# Altium footprint library UAARG Autopilot.PcbLib: 95 footprints (part 3 of 6)
Each footprint in its own frame and in the unit in brackets; x right, y up, seen from the top. Pads: shape width x height; smd on the part's side, far side on the other; paste and mask are expansions set on the pad; w line width, h text height; cw(c..) or ccw(c..) is an arc to the next point about the centre after c.
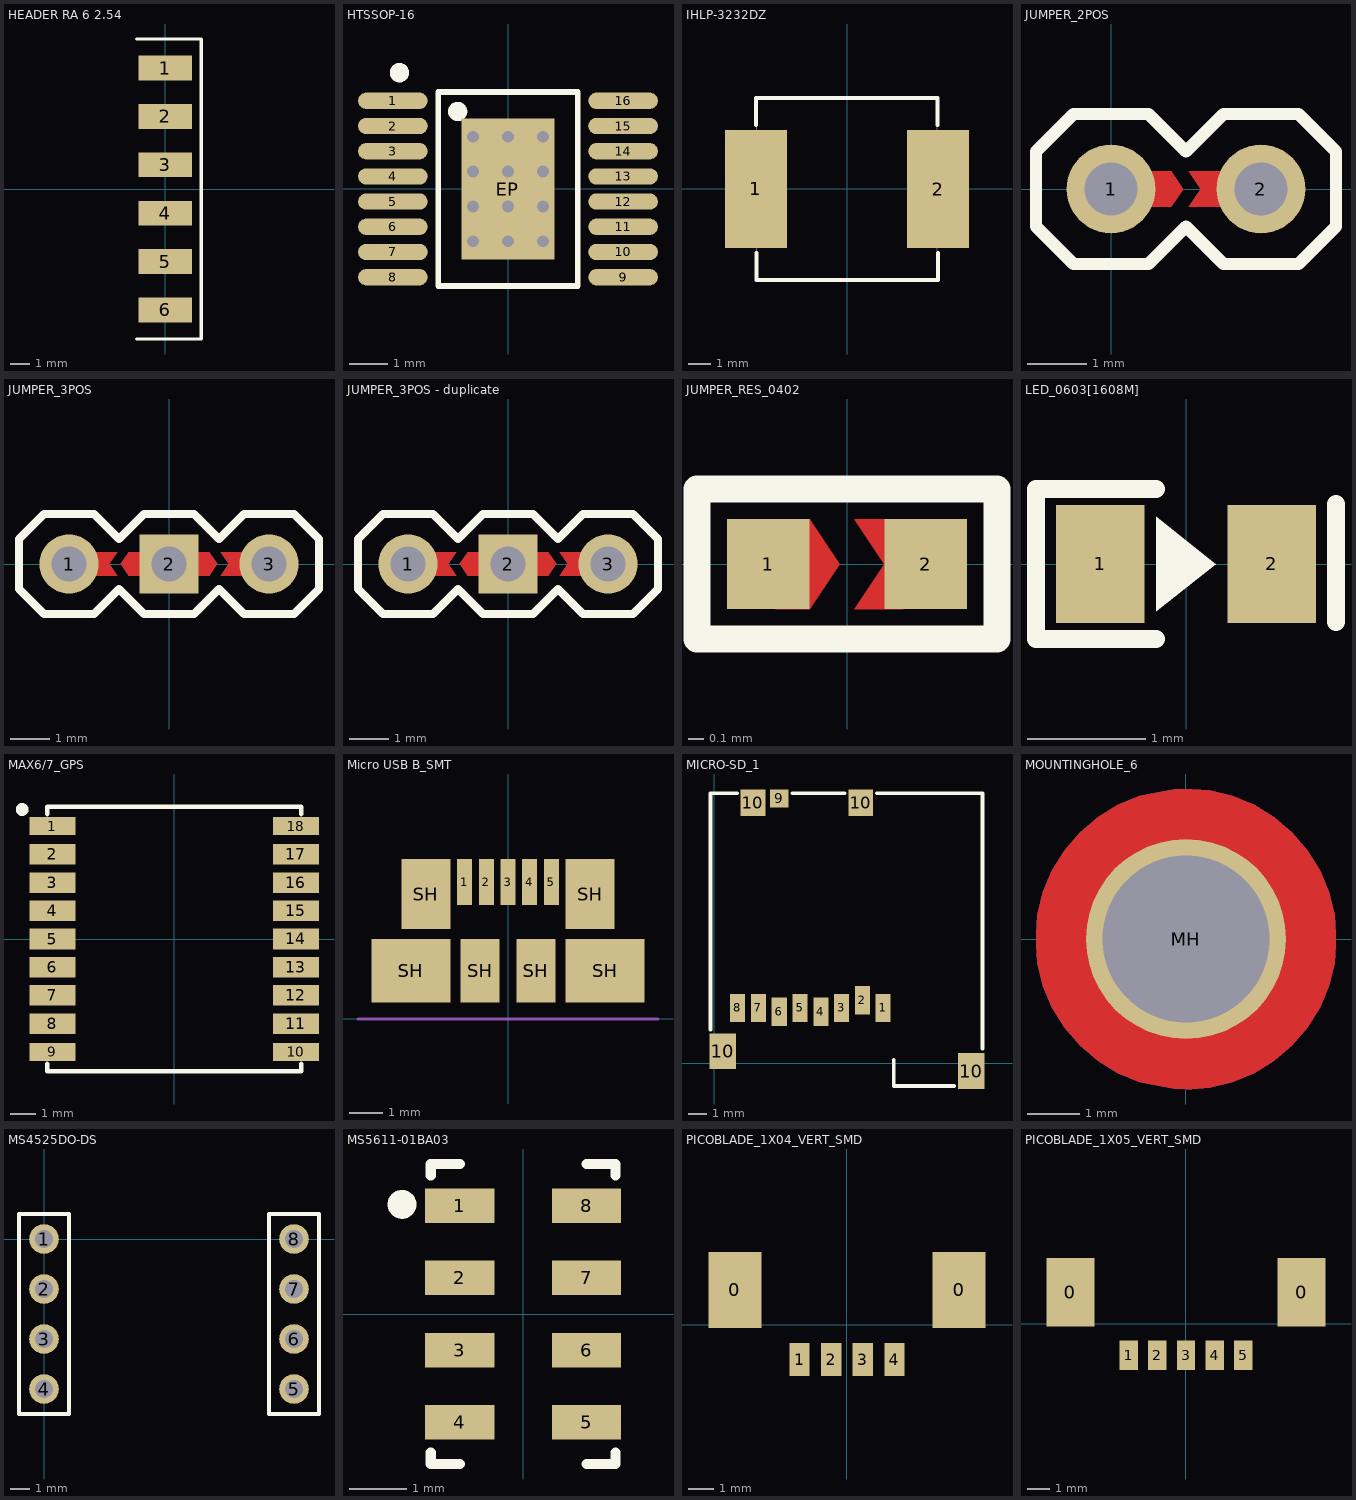
[diagram p2: the footprints below, top view; thin cyan lines are the x and y axes]

## HEADER RA 6 2.54 [mm] "CONN 3M male pin header 6 SMD 961106-5500"
height 2.5
pads (6):
  rect 2.8x1.3 smd: 1(0,6.35) 2(0,3.81) 3(0,1.27) 4(0,-1.27) 5(0,-3.81) 6(0,-6.35)
Top Overlay:
  lines w0.178: -1.5,-7.874 1.905,-7.874 1.905,7.874 -1.5,7.874
3D body: height 2.5, standoff 0, extent -10.818,-7.54 0.682,7.7

## HTSSOP-16 [mm] "Thin-Shrink Small Outline Package (TSSOP), 16-Leads, Body 4.4x5.0mm, Pitch 0.65mm, IPC Medium Density with exposed pad"
height 1.2
pads (17):
  oval 1.8x0.42 smd: 1(-2.97,2.275) 2(-2.97,1.625) 3(-2.97,0.975) 4(-2.97,0.325) 5(-2.97,-0.325) 6(-2.97,-0.975) 7(-2.97,-1.625) 8(-2.97,-2.275) 9(2.97,-2.275) 10(2.97,-1.625) 11(2.97,-0.975) 12(2.97,-0.325) 13(2.97,0.325) 14(2.97,0.975) 15(2.97,1.625) 16(2.97,2.275)
  rect 2.41x3.65 smd: EP(0,0)
via 0,-1.35 diameter 0.61 hole 0.305
via -0.9,-1.35 diameter 0.61 hole 0.305
via 0.9,-1.35 diameter 0.61 hole 0.305
via 0,-0.45 diameter 0.61 hole 0.305
via -0.9,-0.45 diameter 0.61 hole 0.305
via 0.9,-0.45 diameter 0.61 hole 0.305
via -0.9,1.35 diameter 0.61 hole 0.305
via 0.9,1.35 diameter 0.61 hole 0.305
via 0,1.35 diameter 0.61 hole 0.305
via 0.9,0.45 diameter 0.61 hole 0.305
via -0.9,0.45 diameter 0.61 hole 0.305
via 0,0.45 diameter 0.61 hole 0.305
Top Overlay:
  circle w0.25: c-1.3,2 r0.125
  circle w0.25: c-2.8,3 r0.125
  lines w0.152: -1.8,-2.5 -1.8,2.5 1.8,2.5 1.8,-2.5 -1.8,-2.5
3D body: height 1, standoff 0, extent -3.2,-2.5 3.2,2.5

## IHLP-3232DZ [mil] "SMT Inductor IHLP-3232DZ 322x322x158mil"
height 158
pads (2):
  rect 110x210 smd: 1(-162.4,0) 2(162.4,-0.01)
Top Overlay:
  lines w7: -162.4,114.17 -162.4,162.4 161.42,162.4 161.42,114.17 ; -161.42,-114.18 -161.42,-162.41 162.4,-162.41 162.4,-114.18
Mechanical 1:
  lines w1: -170,-100 -116,-100 -116,100 -170,100 -170,-100 ; -161,-161 161,-161 161,161 -161,161 -161,-161 ; 116,-100 170,-100 170,100 116,100 116,-100
3D body: height 158, standoff 5, extent -161,-161 161,161
3D body: height 120, standoff 0, extent 116,-100 170,100
3D body: height 120, standoff 0, extent -170,-100 -116,100

## JUMPER_2POS [mm] "Multi Jumper 2 positions"
pads (2):
  round 1.5 hole 0.9: 1(0,0) 2(2.54,0)
Top Layer:
  region: 0.675,0.3 1.02,0.3 1.22,0 1.02,-0.3 0.675,-0.3
  region: 1.32,0.3 1.52,0 1.32,-0.3 2,-0.3 2,0.3
Bottom Layer:
  region: 0.675,-0.3 1.02,-0.3 1.22,0 1.02,0.3 0.675,0.3
  region: 1.32,-0.3 1.52,0 1.32,0.3 2,0.3 2,-0.3
Top Overlay:
  lines w0.203: -1.27,-0.635 -0.635,-1.27 0.635,-1.27 1.27,-0.635 1.905,-1.27 3.175,-1.27 3.81,-0.635 3.81,0.635 3.175,1.27 1.905,1.27 1.27,0.635 0.635,1.27 -0.635,1.27 -1.27,0.635 -1.27,-0.635
Top Solder:
  rectangle: 0.525,-0.4 2,0.4
Bottom Solder:
  rectangle: 0.525,-0.4 2,0.4
Multi-Layer:
  rectangle: 0,-0.75 0.75,0.75
  region: 2.54,0.75 1.79,0.75 1.79,-0.75 2.54,-0.75
3D body: height 8.6, standoff -3, extent -1.17,-1.246 3.91,1.253

## JUMPER_3POS [mm] "Multi Jumper 3 positions"
pads (3):
  round 1.5 hole 0.9: 1(-2.54,0) 3(2.54,0)
  rect 1.5x1.5 hole 0.9: 2(0,0)
Top Layer:
  region: 1.32,0.3 1.52,0 1.32,-0.3 2,-0.3 2,0.3
  region: 0.675,0.3 1.02,0.3 1.22,0 1.02,-0.3 0.675,-0.3
  region: -0.675,-0.3 -1.02,-0.3 -1.22,0 -1.02,0.3 -0.675,0.3
  region: -1.32,-0.3 -1.52,0 -1.32,0.3 -2,0.3 -2,-0.3
Bottom Layer:
  region: 1.32,-0.3 1.52,0 1.32,0.3 2,0.3 2,-0.3
  region: 0.675,-0.3 1.02,-0.3 1.22,0 1.02,0.3 0.675,0.3
  region: -0.675,0.3 -1.02,0.3 -1.22,0 -1.02,-0.3 -0.675,-0.3
  region: -1.32,0.3 -1.52,0 -1.32,-0.3 -2,-0.3 -2,0.3
Top Overlay:
  lines w0.203: -3.81,-0.635 -3.175,-1.27 -1.905,-1.27 -1.27,-0.635 -0.635,-1.27 0.635,-1.27 1.27,-0.635 1.905,-1.27 3.175,-1.27 3.81,-0.635 3.81,0.635 3.175,1.27 1.905,1.27 1.27,0.635 0.635,1.27 -0.635,1.27 -1.27,0.635 -1.905,1.27 -3.175,1.27 -3.81,0.635 -3.81,-0.635
Top Solder:
  rectangle: 0.525,-0.4 2,0.4
  region: -0.525,0.4 -2,0.4 -2,-0.4 -0.525,-0.4
Bottom Solder:
  rectangle: 0.525,-0.4 2,0.4
  region: -0.525,0.4 -2,0.4 -2,-0.4 -0.525,-0.4
Multi-Layer:
  region: 2.54,0.75 1.79,0.75 1.79,-0.75 2.54,-0.75
  rectangle: -2.54,-0.75 -1.79,0.75
3D body: height 8.6, standoff -3, extent -3.71,-1.246 3.91,1.253

## JUMPER_3POS - duplicate [mm] "Multi Jumper 3 positions"
pads (3):
  round 1.5 hole 0.9: 1(-2.54,0) 3(2.54,0)
  rect 1.5x1.5 hole 0.9: 2(0,0)
Top Layer:
  region: 1.32,0.3 1.52,0 1.32,-0.3 2,-0.3 2,0.3
  region: 0.675,0.3 1.02,0.3 1.22,0 1.02,-0.3 0.675,-0.3
  region: -0.675,-0.3 -1.02,-0.3 -1.22,0 -1.02,0.3 -0.675,0.3
  region: -1.32,-0.3 -1.52,0 -1.32,0.3 -2,0.3 -2,-0.3
Bottom Layer:
  region: 1.32,-0.3 1.52,0 1.32,0.3 2,0.3 2,-0.3
  region: 0.675,-0.3 1.02,-0.3 1.22,0 1.02,0.3 0.675,0.3
  region: -0.675,0.3 -1.02,0.3 -1.22,0 -1.02,-0.3 -0.675,-0.3
  region: -1.32,0.3 -1.52,0 -1.32,-0.3 -2,-0.3 -2,0.3
Top Overlay:
  lines w0.203: -3.81,-0.635 -3.175,-1.27 -1.905,-1.27 -1.27,-0.635 -0.635,-1.27 0.635,-1.27 1.27,-0.635 1.905,-1.27 3.175,-1.27 3.81,-0.635 3.81,0.635 3.175,1.27 1.905,1.27 1.27,0.635 0.635,1.27 -0.635,1.27 -1.27,0.635 -1.905,1.27 -3.175,1.27 -3.81,0.635 -3.81,-0.635
Top Solder:
  rectangle: 0.525,-0.4 2,0.4
  region: -0.525,0.4 -2,0.4 -2,-0.4 -0.525,-0.4
Bottom Solder:
  rectangle: 0.525,-0.4 2,0.4
  region: -0.525,0.4 -2,0.4 -2,-0.4 -0.525,-0.4
Multi-Layer:
  region: 2.54,0.75 1.79,0.75 1.79,-0.75 2.54,-0.75
  rectangle: -2.54,-0.75 -1.79,0.75
3D body: height 8.6, standoff -3, extent -3.71,-1.246 3.91,1.253

## JUMPER_RES_0402 [mm] "Chip SMD Resistor Body 1.0x0.5mm, IPC Low Density with footprint for solder jumper"
height 0.4
pads (2):
  rect 0.55x0.6 smd: 1(-0.525,0) 2(0.525,0)
Top Layer:
  region: 0.05,0.3 0.25,0 0.05,-0.3 0.375,-0.3 0.375,0.3
  region: -0.475,0.3 -0.25,0.3 -0.05,0 -0.25,-0.3 -0.475,-0.3
Top Overlay:
  lines w0.178: -1,-0.5 1,-0.5 1,0.5 -1,0.5 -1,-0.5
Top Solder:
  rectangle: -0.15,-0.4 0.15,0.4
3D body: height 0.34, standoff -0.01, extent -0.5,-0.25 0.5,0.25

## LED_0603[1608M] [mm] "Chip SMD LED Body 1.6x0.8mm, IPC Low Density"
height 0.25
pads (2):
  rect 0.75x1 smd: 1(-0.725,0) 2(0.725,0)
Top Overlay:
  region: 0.25,0 -0.25,-0.4 -0.25,0.4
  lines w0.152: -0.254,-0.635 -1.27,-0.635 -1.27,0.635 -0.254,0.635 ; 1.27,-0.492 1.27,0.508
3D body: height 0.25, standoff 0, extent -0.8,-0.4 0.8,0.4

## MAX6/7_GPS [mm] "u-blox MAX6/7 GNSS module"
height 2.5
pads (18):
  rect 1.8x0.7 smd mask+0.03: 1(-4.75,4.4) 9(-4.75,-4.4) 10(4.75,-4.4) 18(4.75,4.4)
  rect 1.8x0.8 smd mask+0.03: 2(-4.75,3.3) 3(-4.75,2.2) 4(-4.75,1.1) 5(-4.75,0) 6(-4.75,-1.1) 7(-4.75,-2.2) 8(-4.75,-3.3) 11(4.75,-3.3) 12(4.75,-2.2) 13(4.75,-1.1) 14(4.75,0) 15(4.75,1.1) 16(4.75,2.2) 17(4.75,3.3)
Top Overlay:
  circle w0.25: c-5.925,5.05 r0.125
  lines w0.178: -4.95,-4.875 -4.95,-5.15 4.95,-5.15 4.95,-4.875 ; -4.95,4.875 -4.95,5.15 4.95,5.15 4.95,4.875
3D body: height 2.47, standoff 0, extent -4.85,-5.05 4.85,5.05

## Micro USB B_SMT [mm] "Micro USB B SMD R/A; Molex P/N 0473460001"
height 2.45
pads (11):
  rect 0.45x1.38 smd: 1(-1.3,4.11) 2(-0.65,4.11) 3(0,4.11) 4(0.65,4.11) 5(1.3,4.11)
  rect 2.375x1.9 smd: SH(-2.913,1.45) SH(2.913,1.45)
  rect 1.475x2.1 smd: SH(-2.462,3.75) SH(2.462,3.75)
  rect 1.175x1.9 smd: SH(-0.837,1.45) SH(0.837,1.45)
Mechanical 1:
  lines w0.1: -4.5,0 4.5,0
3D body: height 2.72, standoff -0.22, extent -3.99,-0.7 3.99,4.73

## MICRO-SD_1 [mm] "Global Connector Technology MEM2051-00-195-00-A"
height 1.95
pads (13):
  rect 0.8x1.5 smd: 1(8.94,2.94) 2(7.84,3.34) 3(6.74,2.94) 4(5.64,2.74) 5(4.54,2.94) 6(3.44,2.74) 7(2.34,2.94) 8(1.24,2.94)
  rect 1x0.95 smd: 9(3.44,14.025)
  rect 1.4x1.9 smd: 10(0.45,0.65) 10(13.6,-0.4)
  rect 1.3x1.4 smd: 10(2.05,13.8) 10(7.75,13.8)
Top Overlay:
  lines w0.203: -0.2,1.8 -0.2,14.3 1.2,14.3 ; 4.15,14.3 6.9,14.3 ; 8.6,14.3 14.2,14.3 14.2,0.8 ; 9.5,0.2 9.5,-1.2 12.7,-1.2
3D body: height 1.95, standoff 0, extent -0.1,-1.1 14.1,14.25

## MOUNTINGHOLE_6 [mm] "Mounting Hole 6 - Not plated, solder mask open anular ring"
pads (1):
  round 3.81 hole 3.175 unplated mask+0.889: MH(0,0)
Top Layer:
  pour cut-out: 0,-2.857 -0.225,-2.857 -0.885,-2.726 -1.301,-2.554 -1.684,-2.319 -2.026,-2.027 -2.318,-1.685 -2.553,-1.301 -2.726,-0.886 -2.831,-0.449 -2.857,-0.112 -2.857,0 -2.857,0.112 -2.831,0.449 -2.726,0.886 -2.553,1.301 -2.318,1.685 -2.026,2.027 -1.684,2.319 -1.301,2.554 -0.885,2.726 -0.225,2.857 0,2.857 0.112,2.857 0.448,2.831 0.886,2.726 1.301,2.554 1.685,2.319 2.027,2.027 2.319,1.685 2.554,1.301 2.726,0.886 2.831,0.448 2.857,0.112 2.857,0 2.857,-0.112 2.831,-0.448 2.726,-0.886 2.554,-1.301 2.319,-1.685 2.027,-2.027 1.685,-2.319 1.301,-2.554 0.886,-2.726 0.448,-2.831 0.112,-2.857
Bottom Layer:
  pour cut-out: 0,-2.857 -0.225,-2.857 -0.885,-2.726 -1.301,-2.554 -1.684,-2.319 -2.026,-2.027 -2.318,-1.685 -2.553,-1.301 -2.726,-0.886 -2.831,-0.449 -2.857,-0.112 -2.857,0 -2.857,0.112 -2.831,0.449 -2.726,0.886 -2.553,1.301 -2.318,1.685 -2.026,2.027 -1.684,2.319 -1.301,2.554 -0.885,2.726 -0.225,2.857 0,2.857 0.112,2.857 0.448,2.831 0.886,2.726 1.301,2.554 1.685,2.319 2.027,2.027 2.319,1.685 2.554,1.301 2.726,0.886 2.831,0.448 2.857,0.112 2.857,0 2.857,-0.112 2.831,-0.448 2.726,-0.886 2.554,-1.301 2.319,-1.685 2.027,-2.027 1.685,-2.319 1.301,-2.554 0.886,-2.726 0.448,-2.831 0.112,-2.857

## MS4525DO-DS [mm] "Airspeed Sensor MS4525DO-DS"
pads (8):
  round 1.5 hole 0.9: 1(0,0) 2(0,-2.54) 3(0,-5.08) 4(0,-7.62) 5(12.7,-7.62) 6(12.7,-5.08) 7(12.7,-2.54) 8(12.7,0)
Top Overlay:
  lines w0.203: -1.27,-8.89 1.27,-8.89 1.27,1.27 -1.27,1.27 -1.27,-8.89 ; 11.43,-8.89 11.43,1.27 13.97,1.27 13.97,-8.89 11.43,-8.89

## MS5611-01BA03 [mm] "MS5611-01BA03 Pressure Sensor"
height 1
pads (8):
  rect 1.2x0.6 smd: 1(-1.1,1.875) 2(-1.1,0.625) 3(-1.1,-0.625) 4(-1.1,-1.875) 5(1.1,-1.875) 6(1.1,-0.625) 7(1.1,0.625) 8(1.1,1.875)
Top Overlay:
  circle w0.25: c-2.1,1.9 r0.125
  lines w0.178: -1.6,-2.4 -1.6,-2.6 -1.1,-2.6 ; -1.6,2.4 -1.6,2.6 -1.1,2.6 ; 1.1,-2.6 1.6,-2.6 1.6,-2.4 ; 1.1,2.6 1.6,2.6 1.6,2.4
3D body: height 1.05, standoff 0, extent -1.5,-2.5 1.5,2.5

## PICOBLADE_1X04_VERT_SMD [mm] "PicoBlade connector 1x04, vertical, smd, 1.25mm pitch"
height 4.7
pads (6):
  rect 2.1x3 smd: 0(-4.425,1.375) 0(4.425,1.375)
  rect 0.8x1.3 smd: 1(-1.875,-1.375) 2(-0.625,-1.375) 3(0.625,-1.375) 4(1.875,-1.375)
3D body: height 4.7, standoff 0, extent -5.075,-1.728 5.075,2.472

## PICOBLADE_1X05_VERT_SMD [mm] "PicoBlade connector 1x05, vertical, smd, 1.25mm pitch"
height 4.7
pads (7):
  rect 2.1x3 smd: 0(-5.05,1.375) 0(5.05,1.375)
  rect 0.8x1.3 smd: 1(-2.5,-1.375) 2(-1.25,-1.375) 3(0,-1.375) 4(1.25,-1.375) 5(2.5,-1.375)
3D body: height 4.7, standoff 0, extent -5.7,-1.728 5.7,2.472